# Altium footprint library SG__PCB_Modules.PcbLib: 73 footprints (part 2 of 5)
Each footprint in its own frame and in the unit in brackets; x right, y up, seen from the top. Pads: shape width x height; smd on the part's side, far side on the other; paste and mask are expansions set on the pad; w line width, h text height; cw(c..) or ccw(c..) is an arc to the next point about the centre after c.
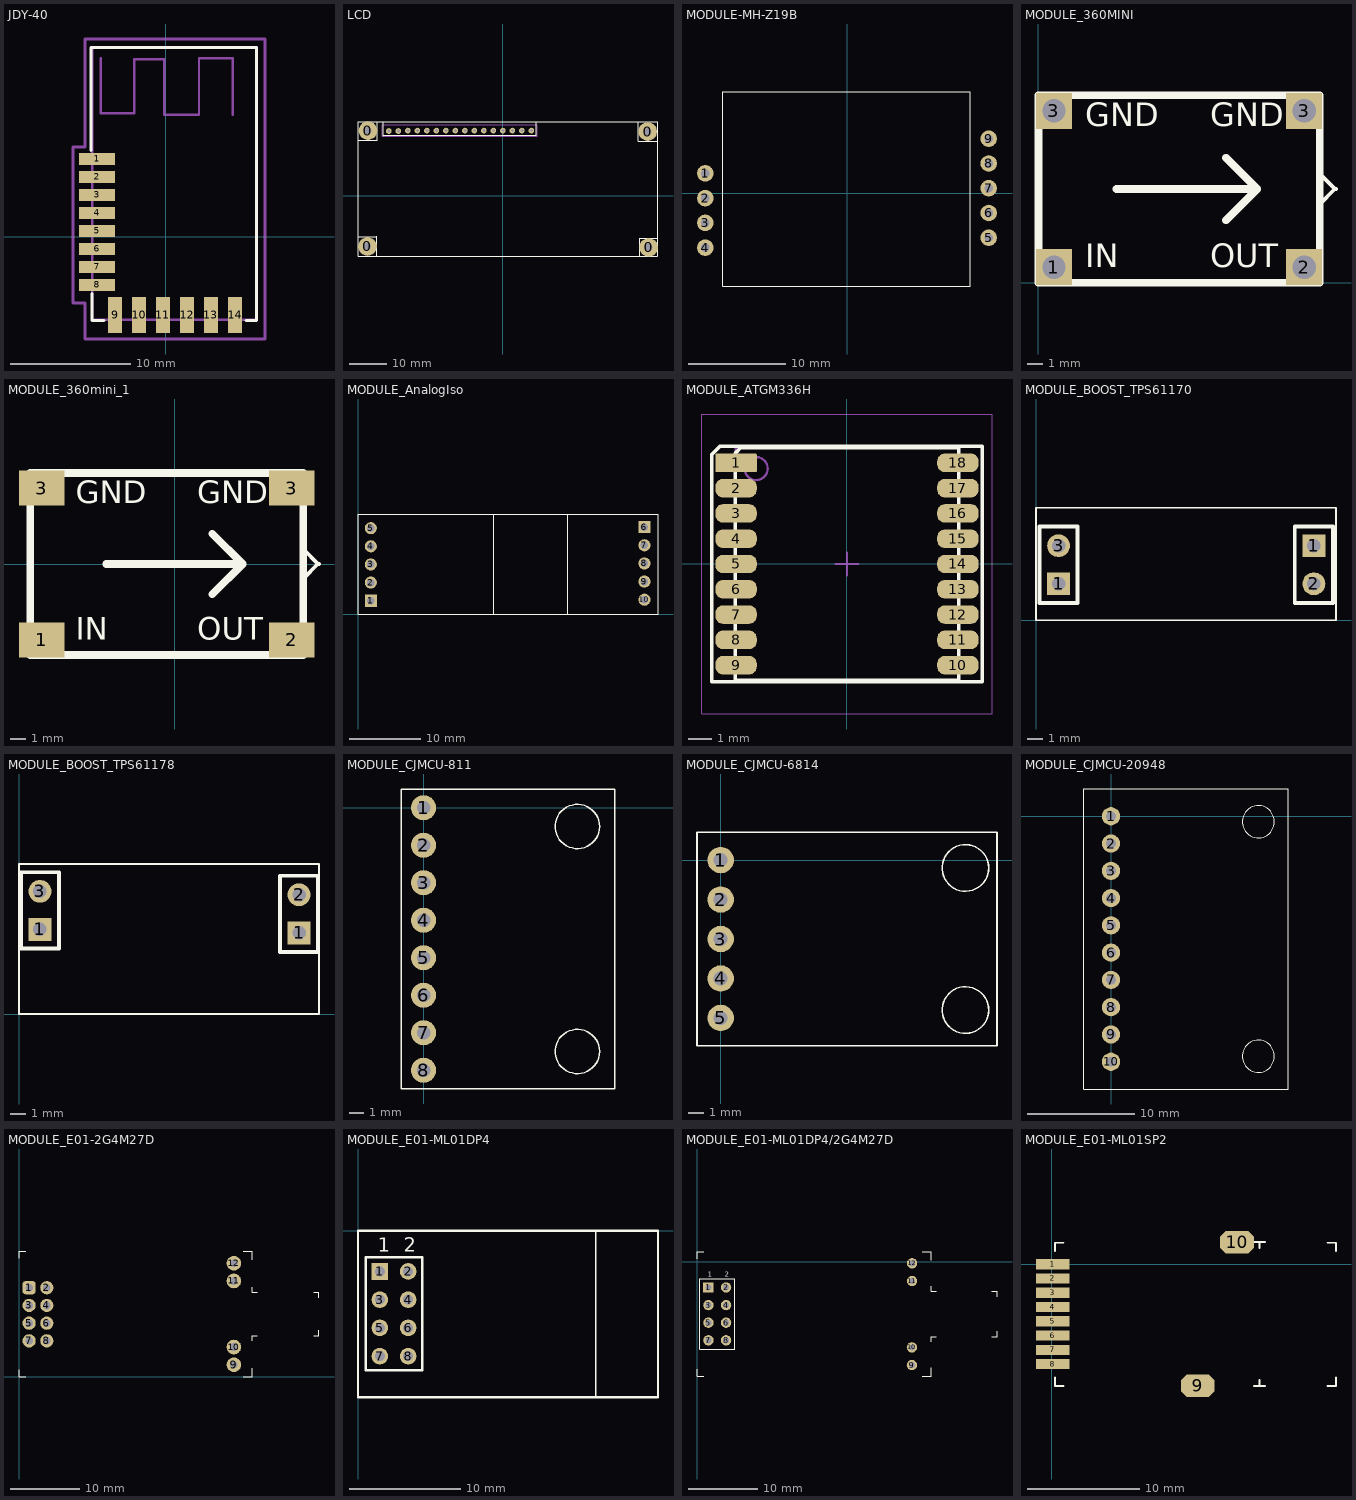
[diagram p1: the footprints below, top view; thin cyan lines are the x and y axes]

## JDY-40 [mm]
pads (14):
  rect 3x1 smd: 1(-5.75,6.5) 2(-5.75,5) 3(-5.75,3.5) 4(-5.75,2) 5(-5.75,0.5) 6(-5.75,-1) 7(-5.75,-2.5) 8(-5.75,-4)
  rect 1.2x3 smd: 9(-4.25,-6.5) 10(-2.25,-6.5) 11(-0.25,-6.5) 12(1.75,-6.5) 13(3.75,-6.5) 14(5.75,-6.5)
Top Overlay:
  lines w0.254: -6.25,7.2 -6.25,15.8 7.55,15.8 7.55,-6.95 6.65,-6.95 ; -6.15,-4.7 -6.15,-6.95 ; -5.15,-6.95 -6.15,-6.95 ; -6.15,-6.95 -6.15,-6.95
Assembly Top:
  lines w0.2: -6.25,15.7 -6.15,15.7 -6.15,-6.9 7.55,-6.9 7.55,15.8 -6.25,15.8 ; -5.45,14.9 -5.45,10.3 -2.65,10.3 -2.65,14.8 -0.15,14.8 -0.15,10.2 2.75,10.2 2.75,14.9 5.55,14.9 5.55,10.2
Courtyard Top:
  lines w0.254: -7.75,-5.5 -7.75,7.5 -6.75,7.5 -6.75,8 -6.75,16.5 8.25,16.5 8.25,-8.5 -6.75,-8.5 -6.75,-5.5 -7.75,-5.5
3D body "JDY-40.stp": height 1.1, standoff 0, extent -6.15,-7.05 7.55,16.05

## LCD [mil]
pads (20):
  round 196.85 hole 78.74: 0(-1425,-535) 0(-1420,685) 0(1525,675) 0(1535,-545)
  round 60 hole 30: 1(-1200,680) 2(-1100,680) 3(-1000,685) 4(-900,685) 5(-800,685) 6(-700,685) 7(-600,685) 8(-500,685) 9(-400,685) 10(-300,685) 11(-200,685) 12(-100,685) 13(0,685) 14(100,685) 15(200,685) 16(300,685)
Top Overlay:
  lines w10: -1525,-435 -1330,-435 -1325,-430 -1325,-640 ; -1525,585 -1330,585 -1320,585 -1320,780 ; -1260,780 -1260,630 -1255,635 350,635 350,780 ; 1425,780 1425,575 1630,575 ; 1440,-640 1440,-450 1630,-450 ; -1525,-640 1625,-640 1630,-635 1630,780 -1520,780 -1525,775 -1525,-640
Courtyard Top:
  lines w7.87: -1267.72,625.98 362.2,625.98 362.2,748.03 -1267.72,748.03 -1267.72,625.98
3D body "lcd.stp": height 582.68, standoff 334.65, extent -1519.8,-637.33 1629.8,780
3D body "connected16.stp": height 433.07, standoff -118.11, extent -1260,630 340,730
3D body "stoyka1.stp": height 393.7, standoff -78.74, extent -1518.43,586.7 -1321.57,783.3
3D body "stoyka1.stp": height 393.7, standoff -78.74, extent -1521.85,-630.07 -1325,-433.47
3D body "stoyka1.stp": height 393.7, standoff -78.74, extent 1433.15,-645.07 1630,-448.47
3D body "stoyka1.stp": height 393.7, standoff -78.74, extent 1423.15,571.7 1620,768.3

## MODULE-MH-Z19B [mm]
pads (9):
  round 1.7 hole 0.9 paste-2539.97 mask-0.05: 1(-14.541,2.032) 2(-14.541,-0.508) 3(-14.541,-3.048) 4(-14.541,-5.588) 5(14.541,-4.572) 6(14.541,-2.032) 7(14.541,0.508) 8(14.541,3.048) 9(14.541,5.588)
Top Overlay:
  lines w0.102: -12.763,-9.572 12.636,-9.572 12.636,10.428 -12.763,10.428 -12.763,-9.572
3D body: height 4.5, standoff 3, extent -15.748,-9.572 15.748,10.428
3D body: height 11.5, standoff 4.5, extent -12.763,-9.572 12.636,10.428
3D body "PLS1.stp": height 8.54, standoff -3, extent -15.811,-1.778 -13.271,0.762
3D body "PLS1.stp": height 8.54, standoff -3, extent -15.811,0.762 -13.271,3.302
3D body "PLS1.stp": height 8.54, standoff -3, extent -15.811,-4.318 -13.271,-1.778
3D body "PLS1.stp": height 8.54, standoff -3, extent -15.811,-6.858 -13.271,-4.318
3D body "PLS1.stp": height 8.54, standoff -3, extent 13.272,4.318 15.812,6.858
3D body "PLS1.stp": height 8.54, standoff -3, extent 13.272,1.778 15.812,4.318
3D body "PLS1.stp": height 8.54, standoff -3, extent 13.272,-0.762 15.812,1.778
3D body "PLS1.stp": height 8.54, standoff -3, extent 13.272,-3.302 15.812,-0.762
3D body "PLS1.stp": height 8.54, standoff -3, extent 13.272,-5.842 15.812,-3.302

## MODULE_360MINI [mm]
pads (4):
  rect 2.3x2.3 hole 1.5: 1(0.991,1) 2(16.991,1) 3(0.991,11) 3(16.991,11)
Top Overlay:
  lines w0.254: 17.991,5.046 18.945,6 19.025,6 18.96,6 17.991,6.969
  lines w0.5: 4.991,6 13.991,6 ; 11.991,4 13.991,6 ; 11.991,8 13.991,6 ; 13.991,6 13.991,6 ; -0.009,0 -0.009,12 17.991,12 17.991,0 -0.009,0
  text "GND" at 10.991,10 h1.5
  text "GND" at 2.991,10 h1.5
  text "OUT" at 10.991,1 h1.5
  text "IN" at 2.991,1 h1.5
3D body: height 3.5, standoff 0.2, extent -0.009,0 17.991,12

## MODULE_360mini_1 [mm]
pads (4):
  rect 3x2.3 smd: 1(-8.759,-5) 2(7.741,-5) 3(-8.759,5) 3(7.741,5)
Top Overlay:
  lines w0.254: 8.491,-0.954 9.445,0 9.525,0 9.46,0 8.491,0.969
  lines w0.5: -4.509,0 4.491,0 ; 2.491,-2 4.491,0 ; 2.491,2 4.491,0 ; 4.491,0 4.491,0 ; -9.509,-6 -9.509,6 8.491,6 8.491,-6 -9.509,-6
  text "GND" at 1.491,4 h1.5
  text "GND" at -6.509,4 h1.5
  text "OUT" at 1.491,-5 h1.5
  text "IN" at -6.509,-5 h1.5
3D body: height 3.5, standoff 0.2, extent -9.509,-6 8.491,6

## MODULE_AnalogIso [mm]
pads (10):
  rect 1.7x1.7 hole 1.05 mask+0.05: 1(1.8,1.86) 6(40.1,12.16)
  round 1.7 hole 1.05 mask+0.05: 2(1.8,4.4) 3(1.8,6.94) 4(1.8,9.48) 5(1.8,12.02) 7(40.1,9.62) 8(40.1,7.08) 9(40.1,4.54) 10(40.1,2)
Top Overlay:
  lines w0.152: 19,0 19,14 ; 29.4,0 29.4,14 ; 0,0 42,0 42,14 0,14 0,0
3D body: height 3.6, standoff 2.4, extent 19,-0.1 29.4,14.1
3D body: height 3.5, standoff 2.5, extent 0,-0.025 42,13.975
3D body "PLS1.stp": height 8.54, standoff -3, extent 0.53,10.75 3.07,13.29
3D body "PLS1.stp": height 8.54, standoff -3, extent 0.53,8.21 3.07,10.75
3D body "PLS1.stp": height 8.54, standoff -3, extent 0.53,5.67 3.07,8.21
3D body "PLS1.stp": height 8.54, standoff -3, extent 0.53,3.13 3.07,5.67
3D body "PLS1.stp": height 8.54, standoff -3, extent 0.53,0.59 3.07,3.13
3D body "PLS1.stp": height 8.54, standoff -3, extent 38.83,0.73 41.37,3.27
3D body "PLS1.stp": height 8.54, standoff -3, extent 38.83,3.27 41.37,5.81
3D body "PLS1.stp": height 8.54, standoff -3, extent 38.83,5.81 41.37,8.35
3D body "PLS1.stp": height 8.54, standoff -3, extent 38.83,8.35 41.37,10.89
3D body "PLS1.stp": height 8.54, standoff -3, extent 38.83,10.89 41.37,13.43
3D body "TO-92B.step": height 9.58, standoff 1.12, extent 34.798,8.255 38.1,12.827
3D body "TO-92B.step": height 9.58, standoff 1.12, extent 31.623,1.27 34.925,5.842
3D body "TO-92B.step": height 9.58, standoff 1.12, extent 13.208,1.905 16.51,6.477
3D body "TO-92B.step": height 9.58, standoff 1.12, extent 8.89,7.112 12.192,11.684
3D body "RESC1608X04N.step": height 3.95, standoff 3.5, extent 10.878,3.518 11.728,5.118
3D body "RESC1608X04N.step": height 3.95, standoff 3.5, extent 35.516,5.232 36.366,6.832
3D body "RESC1608X04N.step": height 3.95, standoff 3.5, extent 4.47,9.1 6.07,9.95
3D body "RESC1608X04N.step": height 3.95, standoff 3.5, extent 32.22,11.894 33.82,12.744
3D body "RESC1608X04N.step": height 3.95, standoff 3.5, extent 14.059,7.83 15.659,8.68
3D body "RESC1608X04N.step": height 3.95, standoff 3.5, extent 33.484,7.074 34.334,8.674
3D body "RESC1608X04N.step": height 3.95, standoff 3.5, extent 32.22,10.116 33.82,10.966
3D body "RESC1608X04N.step": height 3.95, standoff 3.5, extent 31.579,7.074 32.429,8.674
3D body "CAPC1608X09N.step": height 4.4, standoff 3.5, extent 4.274,5.36 5.124,6.96
3D body "CAPC1608X09N.step": height 4.4, standoff 3.5, extent 37.294,5.232 38.144,6.832
3D body "CAPC1608X09N.step": height 4.4, standoff 3.5, extent 4.274,1.803 5.124,3.403
3D body "CAPC1608X09N.step": height 4.4, standoff 3.5, extent 37.294,1.93 38.144,3.53

## MODULE_ATGM336H [mm] "PQFN, 18-Leads, Body 9,70x10,10mm, Pitch 1,10mm, IPC Low Density"
height 2.6
pads (18):
  rrect10% 1.8x0.8 smd: 1(-4.825,4.4)
  rrect80% 1.8x0.8 smd: 2(-4.825,3.3) 3(-4.825,2.2) 4(-4.825,1.1) 5(-4.825,0) 6(-4.825,-1.1) 7(-4.825,-2.2) 8(-4.825,-3.3) 9(-4.825,-4.4) 10(4.825,-4.4) 11(4.825,-3.3) 12(4.825,-2.2) 13(4.825,-1.1) 14(4.825,0) 15(4.825,1.1) 16(4.825,2.2) 17(4.825,3.3) 18(4.825,4.4)
Top Overlay:
  lines w0.152: 4.521,-5.131 5.893,-5.131 5.893,5.131 -4.851,5.131 -5.512,5.131 -5.893,4.75 -5.893,-5.131 4.547,-5.131 ; -4.851,-5.055 4.851,-5.055 4.851,5.055 -4.623,5.055 -4.851,4.826 -4.851,-5.055
Assembly Top:
  circle w0.1: c-3.95,4.15 r0.5
  lines w0.1: -4.85,-5.05 -4.85,5.05 4.85,5.05 4.85,-5.05 -4.85,-5.05
Courtyard Top:
  lines w0.05: -6.325,-6.525 -6.325,6.525 6.325,6.525 6.325,-6.525 -6.325,-6.525
  lines w0.1: -0.5,0 0.5,0 ; 0,-0.5 0,0.5
3D body "ATGM336H.stp": height 2.6, standoff 0, extent -4.85,-5.05 4.85,5.05

## MODULE_BOOST_TPS61170 [mm]
pads (4):
  rect 1.524x1.524 hole 0.9: 1(1.506,2.43) 1(18.524,4.97)
  round 1.524 hole 0.9: 2(18.524,2.43) 3(1.506,4.97)
Top Overlay:
  lines w0.127: 0,0 20,0 20,7.5 0,7.5 0,0
  lines w0.254: 0.236,1.16 2.776,1.16 2.776,6.24 0.236,6.24 0.236,1.16 ; 17.254,1.16 17.254,6.24 19.794,6.24 19.794,1.16 17.254,1.16
3D body "PLS1.stp": height 8.54, standoff -3, extent 0.236,3.7 2.776,6.24
3D body "PLS1.stp": height 8.54, standoff -3, extent 0.236,1.16 2.776,3.7
3D body "PLS1.stp": height 8.54, standoff -3, extent 17.254,3.7 19.794,6.24
3D body "PLS1.stp": height 8.54, standoff -3, extent 17.254,1.16 19.794,3.7

## MODULE_BOOST_TPS61178 [mil]
pads (4):
  rect 60x60 hole 35.43: 1(55,222) 1(735,213)
  round 60 hole 35.43: 2(735,313) 3(55,322)
Top Overlay:
  lines w5: 0,0 0,393.7 787.4,393.7 787.4,236.22 787.4,0 0,0
  lines w10: 5,172 105,172 105,372 5,372 5,172 ; 685,163 785,163 785,363 685,363 685,163
3D body "PLS1.stp": height 336.22, standoff -118.11, extent 5,272 105,372
3D body "PLS1.stp": height 336.22, standoff -118.11, extent 5,172 105,272
3D body "PLS1.stp": height 336.22, standoff -118.11, extent 685,263 785,363
3D body "PLS1.stp": height 336.22, standoff -118.11, extent 685,163 785,263

## MODULE_CJMCU-811 [mm]
pads (8):
  round 1.7 hole 0.9 paste-2539.97 mask-0.05: 1(0,0) 2(0,-2.54) 3(0,-5.08) 4(0,-7.62) 5(0,-10.16) 6(0,-12.7) 7(0,-15.24) 8(0,-17.78)
Top Overlay:
  circle w0.102: c10.414,-16.51 r1.5
  circle w0.102: c10.414,-1.27 r1.5
  lines w0.102: -1.524,-19.05 -1.524,1.27 12.954,1.27 12.954,-19.05 -1.524,-19.05
3D body: height 4.5, standoff 3, extent -1.524,-19.05 12.954,1.27
3D body: height 5.5, standoff 4.5, extent 5.08,-10.16 9.525,-7.62
3D body "PLS1.stp": height 8.54, standoff -3, extent -1.27,-19.05 1.27,-16.51
3D body "PLS1.stp": height 8.54, standoff -3, extent -1.27,-16.51 1.27,-13.97
3D body "PLS1.stp": height 8.54, standoff -3, extent -1.27,-13.97 1.27,-11.43
3D body "PLS1.stp": height 8.54, standoff -3, extent -1.27,-11.43 1.27,-8.89
3D body "PLS1.stp": height 8.54, standoff -3, extent -1.27,-8.89 1.27,-6.35
3D body "PLS1.stp": height 8.54, standoff -3, extent -1.27,-6.35 1.27,-3.81
3D body "PLS1.stp": height 8.54, standoff -3, extent -1.27,-3.81 1.27,-1.27
3D body "PLS1.stp": height 8.54, standoff -3, extent -1.27,-1.27 1.27,1.27

## MODULE_CJMCU-6814 [mm]
pads (5):
  round 1.7 hole 0.9 paste-2539.97 mask-0.05: 1(0,0) 2(0,-2.54) 3(0,-5.08) 4(0,-7.62) 5(0,-10.16)
Top Overlay:
  circle w0.102: c15.748,-0.508 r1.5
  circle w0.102: c15.748,-9.652 r1.5
  lines w0.102: -1.524,-11.938 -1.524,1.778 17.78,1.778 17.78,-11.938 -1.524,-11.938
3D body: height 4.5, standoff 3, extent -1.524,-11.938 17.78,1.778
3D body "PLS1.stp": height 8.54, standoff -3, extent -1.27,-11.43 1.27,-8.89
3D body "PLS1.stp": height 8.54, standoff -3, extent -1.27,-8.89 1.27,-6.35
3D body "PLS1.stp": height 8.54, standoff -3, extent -1.27,-6.35 1.27,-3.81
3D body "PLS1.stp": height 8.54, standoff -3, extent -1.27,-3.81 1.27,-1.27
3D body "PLS1.stp": height 8.54, standoff -3, extent -1.27,-1.27 1.27,1.27

## MODULE_CJMCU-20948 [mm]
pads (10):
  round 1.7 hole 0.9 paste-2539.97 mask-0.05: 1(0,0) 2(0,-2.54) 3(0,-5.08) 4(0,-7.62) 5(0,-10.16) 6(0,-12.7) 7(0,-15.24) 8(0,-17.78) 9(0,-20.32) 10(0,-22.86)
Top Overlay:
  circle w0.102: c13.716,-0.508 r1.5
  circle w0.102: c13.716,-22.352 r1.5
  lines w0.102: -2.54,-25.4 -2.54,2.54 16.51,2.54 16.51,-25.4 -2.54,-25.4
3D body "PLS1.stp": height 8.54, standoff -3, extent -1.27,-1.27 1.27,1.27
3D body "PLS1.stp": height 8.54, standoff -3, extent -1.27,-3.81 1.27,-1.27
3D body "PLS1.stp": height 8.54, standoff -3, extent -1.27,-6.35 1.27,-3.81
3D body "PLS1.stp": height 8.54, standoff -3, extent -1.27,-8.89 1.27,-6.35
3D body "PLS1.stp": height 8.54, standoff -3, extent -1.27,-11.43 1.27,-8.89
3D body "PLS1.stp": height 8.54, standoff -3, extent -1.27,-13.97 1.27,-11.43
3D body "PLS1.stp": height 8.54, standoff -3, extent -1.27,-16.51 1.27,-13.97
3D body "PLS1.stp": height 8.54, standoff -3, extent -1.27,-19.05 1.27,-16.51
3D body "PLS1.stp": height 8.54, standoff -3, extent -1.27,-21.59 1.27,-19.05
3D body "PLS1.stp": height 8.54, standoff -3, extent -1.27,-24.13 1.27,-21.59
3D body: height 4.5, standoff 3, extent -2.54,-25.4 16.51,2.54

## MODULE_E01-2G4M27D [mm]
height 8
pads (12):
  rrect50% 1.9x1.9 hole 1.1: 1(1.45,12.77)
  round 1.9 hole 1.1: 2(3.99,12.77) 3(1.45,10.23) 4(3.99,10.23) 5(1.45,7.69) 6(3.99,7.69) 7(1.45,5.15) 8(3.99,5.15)
  round 2.1 hole 1.1: 9(30.8,1.725) 10(30.8,4.265) 11(30.8,13.735) 12(30.8,16.275)
Top Overlay:
  lines w0.152: 0,1 0,0 1,0 ; 0,17 0,18 1,18 ; 32.15,0 33.4,0 33.4,1.25 ; 32.15,18 33.4,18 33.4,16.75 ; 33.4,5.15 33.4,5.9 34.15,5.9 ; 33.4,12.85 33.4,12.1 34.15,12.1 ; 42.25,5.9 43,5.9 43,6.65 ; 42.25,12.1 43,12.1 43,11.35
3D body: height 5, standoff -1, extent 1.2,12.52 1.7,13.02
3D body: height 5, standoff -1, extent 1.2,9.98 1.7,10.48
3D body: height 5, standoff -1, extent 1.2,7.44 1.7,7.94
3D body: height 5, standoff -1, extent 1.2,4.9 1.7,5.4
3D body: height 4.01, standoff 2.99, extent 0.656,11.972 2.25,13.569
3D body: height 4.01, standoff 2.99, extent 0.656,9.432 2.25,11.029
3D body: height 4.01, standoff 2.99, extent 0.656,6.892 2.25,8.489
3D body: height 4.01, standoff 2.99, extent 0.656,4.352 2.25,5.949
3D body: height 5, standoff -1, extent 3.74,12.52 4.24,13.02
3D body: height 5, standoff -1, extent 3.74,9.98 4.24,10.48
3D body: height 5, standoff -1, extent 3.74,7.44 4.24,7.94
3D body: height 5, standoff -1, extent 3.74,4.9 4.24,5.4
3D body: height 4.01, standoff 2.99, extent 3.196,6.892 4.79,8.489
3D body: height 4.01, standoff 2.99, extent 3.196,9.432 4.79,11.029
3D body: height 4.01, standoff 2.99, extent 3.196,4.352 4.79,5.949
3D body: height 4.01, standoff 2.99, extent 3.206,11.972 4.8,13.569
3D body: height 4, standoff 3, extent 0,0 33.4,18
3D body: height 6.42, standoff 3.92, extent 5.5,1 29.4,17
3D body: height 5, standoff -1, extent 30.55,16.025 31.05,16.525
3D body: height 5, standoff -1, extent 30.55,13.485 31.05,13.985
3D body: height 5, standoff -1, extent 30.55,4.015 31.05,4.515
3D body: height 5, standoff -1, extent 30.55,1.475 31.05,1.975
3D body: height 4.01, standoff 2.99, extent 30.006,15.477 31.6,17.074
3D body: height 4.01, standoff 2.99, extent 30.006,12.937 31.6,14.534
3D body: height 4.01, standoff 2.99, extent 30.006,3.467 31.6,5.064
3D body: height 4.01, standoff 2.99, extent 30.006,0.927 31.6,2.524
3D body: height 4.9, standoff 3.9, extent 30.6,8.5 34.6,9.498
3D body: height 7.2, standoff 1, extent 32.5,5.9 43,12.1

## MODULE_E01-ML01DP4 [mm]
height 1
pads (8):
  rect 1.5x1.5 hole 0.9: 1(1.97,-3.67)
  round 1.5 hole 0.9: 2(4.51,-3.67) 3(1.97,-6.21) 4(4.51,-6.21) 5(1.97,-8.75) 6(4.51,-8.75) 7(1.97,-11.29) 8(4.51,-11.29)
Top Overlay:
  lines w0.15: 21.4,-15 21.4,0
  lines w0.2: 0,-15 0,0 27,0 27,-15 0,-15 ; 0.7,-12.56 5.78,-12.56 5.78,-2.4 0.7,-2.4 0.7,-12.56
  text "2" at 4.1,-1.9 h1.27
  text "1" at 1.8,-1.9 h1.27
3D body: height 2, standoff 0, extent 0,-15 27,0

## MODULE_E01-ML01DP4/2G4M27D [mm]
height 1
pads (12):
  rect 1.5x1.5 hole 0.9: 1(1.65,-3.675)
  round 1.5 hole 0.9: 2(4.19,-3.675) 3(1.65,-6.215) 4(4.19,-6.215) 5(1.65,-8.755) 6(4.19,-8.755) 7(1.65,-11.295) 8(4.19,-11.295) 9(30.988,-14.859) 10(30.988,-12.319) 11(31,-2.743) 12(31,-0.2)
Top Overlay:
  lines w0.152: 0,-15.5 0,-16.5 1,-16.5 ; 0,0.5 0,1.5 1,1.5 ; 32.5,-16.5 33.75,-16.5 33.75,-15.25 ; 32.5,1.5 33.75,1.5 33.75,0.25 ; 33.75,-11.5 33.75,-10.75 34.5,-10.75 ; 33.75,-3.5 33.75,-4.25 34.5,-4.25 ; 42.5,-10.75 43.25,-10.75 43.25,-10 ; 42.5,-4.25 43.25,-4.25 43.25,-5 ; 0.38,-12.565 0.38,-2.405 5.46,-2.405 5.46,-12.565 0.38,-12.565
  text "1" at 1.525,-2.125 h0.76
  text "2" at 3.975,-2.125 h0.76
3D body: height 5, standoff 0.1, extent 0,-16.5 43.25,1.5

## MODULE_E01-ML01SP2 [mm]
pads (10):
  rect 3x0.9 smd: 1(0.11,0) 2(0.11,-1.27) 3(0.11,-2.54) 4(0.11,-3.81) 5(0.11,-5.08) 6(0.11,-6.35) 7(0.11,-7.62) 8(0.11,-8.89)
  oct 3x2 smd: 9(13,-10.83) 10(16.5,1.97)
Top Overlay:
  lines w0.152: 0.3,-10.08 0.3,-10.83 1.05,-10.83 ; 0.3,1.17 0.3,1.92 1.05,1.92 ; 18,-10.83 19,-10.83 ; 18,1.97 19,1.97 ; 18.5,-10.83 18.5,-10.3 ; 18.5,1.44 18.5,1.97 ; 24.55,-10.83 25.3,-10.83 25.3,-10.08 ; 24.55,1.92 25.3,1.92 25.3,1.17
3D body: height 1.5, standoff 0, extent 0.5,-10.83 25.5,1.97